# Altium footprint library IoWLabsModules.PcbLib: 54 footprints (part 4 of 4)
Each footprint in its own frame and in the unit in brackets; x right, y up, seen from the top. Pads: shape width x height; smd on the part's side, far side on the other; paste and mask are expansions set on the pad; w line width, h text height; cw(c..) or ccw(c..) is an arc to the next point about the centre after c.
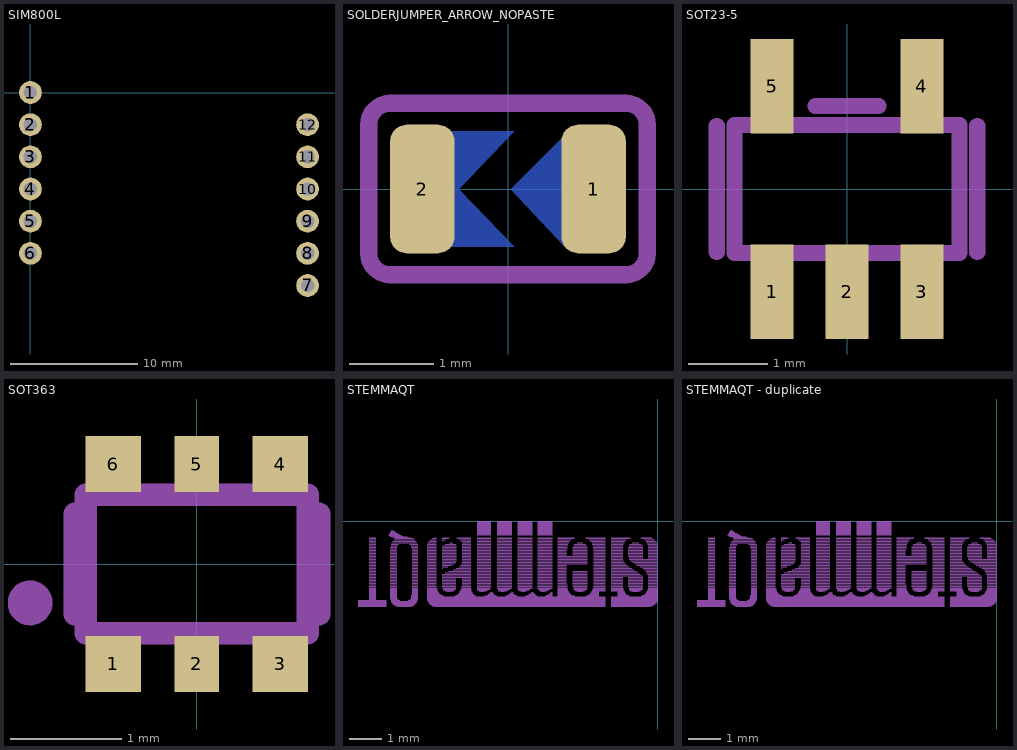
[diagram p3: the footprints below, top view; thin cyan lines are the x and y axes]

## SIM800L [mm] "SIM800L MODULE VERSION"
pads (12):
  round 1.8 hole 1.05: 1(0,0) 2(0,-2.54) 3(0,-5.08) 4(0,-7.62) 5(0,-10.16) 6(0,-12.7) 7(21.89,-15.24) 8(21.89,-12.7) 9(21.89,-10.16) 10(21.89,-7.62) 11(21.89,-5.08) 12(21.89,-2.54)
3D body "SIM800L v10.step": height 3.78, standoff -1.99, extent -1.8,-18.025 23.218,4.975

## SOLDERJUMPER_ARROW_NOPASTE [mil] "SOLDERJUMPER_ARROW_NOPASTE"
pads (2):
  rrect50% 30x60 smd paste-30 mask-30: 1(40,0) 2(-40,0)
Bottom Layer:
  region: 50.91,-27.03 26.44,-27.03 1.37,0 28.41,27.03 50.91,27.03
  region: 3.03,-27.03 -23,0 3.03,27.03 -50.91,27.03 -50.91,-27.03
Bottom Solder:
  region: 57.5,32.5 -57.5,32.5 -57.5,-32.5 57.5,-32.5
Mechanical 3:
  lines w8: -65,-30 ccw(c-55,-30) -55,-40 55,-40 ccw(c55,-30) 65,-30 65,30 ccw(c55,30) 55,40 -55,40 ccw(c-55,30) -65,30 -65,-30

## SOT23-5 [mm] "SOT23-5"
pads (5):
  rect 0.55x1.2 smd: 1(-0.95,-1.3) 2(0,-1.3) 3(0.95,-1.3) 4(0.95,1.3) 5(-0.95,1.3)
Mechanical 2:
  lines w0.203: -1.65,-0.8 -1.65,0.8 ; -0.4,1.05 0.4,1.05 ; 1.65,-0.8 1.65,0.8
Mechanical 18:
  rectangle: -1.2,0.85 -0.7,1.5
  rectangle: 0.7,0.85 1.2,1.5
  rectangle: 0.7,-1.5 1.2,-0.85
  rectangle: -0.25,-1.5 0.25,-0.85
  rectangle: -1.2,-1.5 -0.7,-0.85
  lines w0.203: -1.422,-0.811 -1.422,0.811 1.422,0.811 1.422,-0.811 -1.422,-0.811

## SOT363 [mm] "SOT363"
pads (6):
  rect 0.5x0.5 smd: 1(-0.75,-0.9) 3(0.75,-0.9) 4(0.75,0.9) 6(-0.75,0.9)
  rect 0.4x0.5 smd: 2(0,-0.9) 5(0,0.9)
Mechanical 2:
  circle w0.203: c-1.5,-0.35 r0.1
  lines w0.203: -1.1,-0.45 -1.1,0.45 ; 1.1,-0.45 1.1,0.45
Mechanical 18:
  rectangle: -0.125,-1.05 0.125,-0.7
  rectangle: -0.775,-1.05 -0.525,-0.7
  rectangle: 0.525,-1.05 0.775,-0.7
  rectangle: -0.775,0.7 -0.525,1.05
  rectangle: -0.125,0.7 0.125,1.05
  rectangle: 0.525,0.7 0.775,1.05
  lines w0.203: -1,-0.625 1,-0.625 1,0.625 -1,0.625 -1,-0.625

## STEMMAQT [mm] "STEMMAQT"
Mechanical 3:
  drawing of 1315 lines, arcs and shapes, not listed

## STEMMAQT - duplicate [mm] "STEMMAQT"
Mechanical 3:
  drawing of 1315 lines, arcs and shapes, not listed